# Altium footprint library Footprints_SOC.PcbLib: 182 footprints (part 1 of 12)
Each footprint in its own frame and in the unit in brackets; x right, y up, seen from the top. Pads: shape width x height; smd on the part's side, far side on the other; paste and mask are expansions set on the pad; w line width, h text height; cw(c..) or ccw(c..) is an arc to the next point about the centre after c.
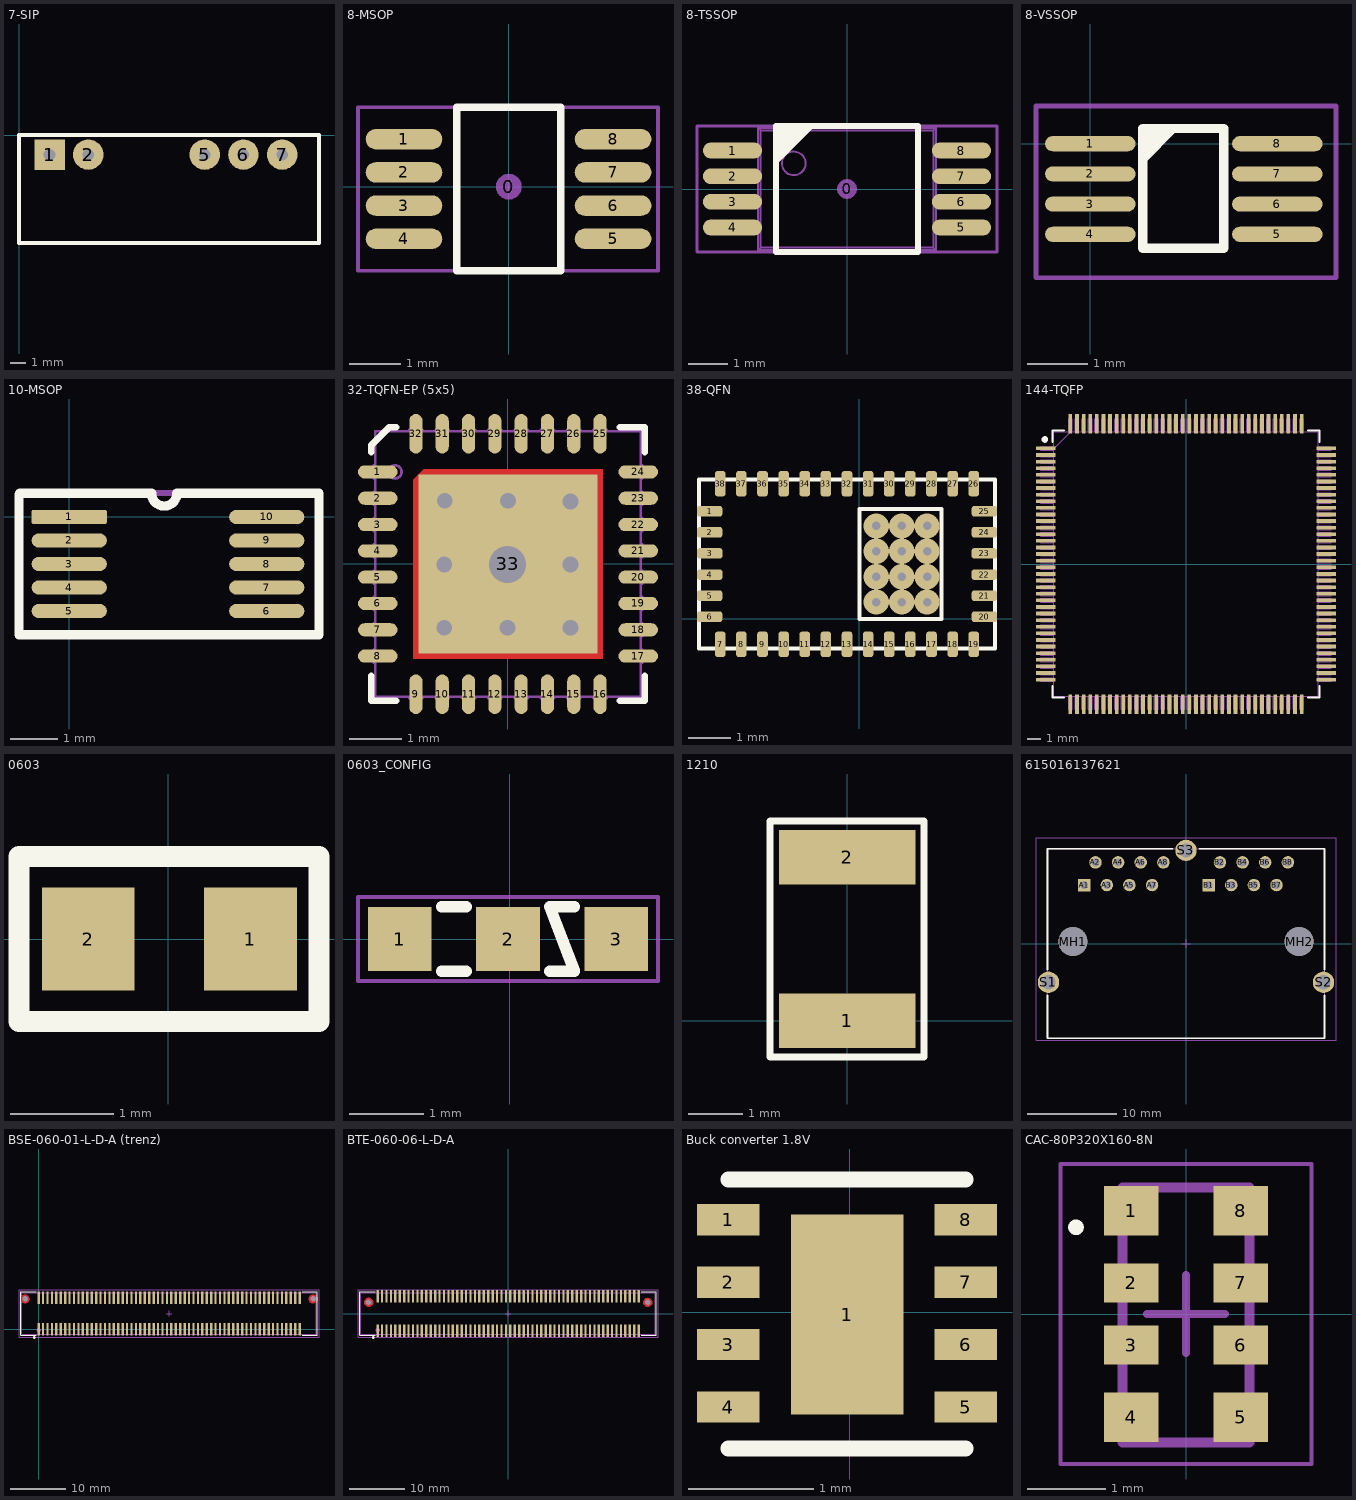
[diagram p0: the footprints below, top view; thin cyan lines are the x and y axes]

## 7-SIP [mm] "5 pins"
pads (5):
  rect 2x2 hole 0.762: 1(2,-1.27)
  round 2 hole 0.762: 2(4.54,-1.27) 5(12.16,-1.27) 6(14.7,-1.27) 7(17.24,-1.27)
Top Overlay:
  lines w0.254: 0,-7.05 19.65,-7.05 19.65,0 0,0 0,-7.05
3D body "DC DC RECOM SERIE RKZ_S.step": height 10.5, standoff -3.8, extent 0,-7.05 19.65,0

## 8-MSOP [mm] "8 Leads, Body 3.1x4.5mm (max), Pitch 0.65mm, IPC Medium Density"
height 1.2
pads (9):
  round 0.508 on Mech15: 0(0,0)
  oval 1.5x0.4 smd paste-0.051: 1(-2.05,0.93) 2(-2.05,0.28) 3(-2.05,-0.37) 4(-2.05,-1.02) 5(2.04,-1.02) 6(2.04,-0.37) 7(2.04,0.28) 8(2.04,0.93)
Top Overlay:
  lines w0.152: -1.016,-1.645 -1.016,1.555 1.016,1.555 1.016,-1.645 -1.016,-1.645
  text "." at -2,1.655 h0.1
Mechanical 15:
  lines w0.076: -2.95,-1.645 -2.95,1.555 2.92,1.555 2.92,-1.645 -2.95,-1.645
3D body "msop-8.SLDPRT": height 1.15, standoff 0, extent -2.45,-1.53 2.45,1.47

## 8-TSSOP [mm] "TSSOP, 8 Leads, Body 3.1x4.5mm (max), Pitch 0.65mm, IPC Medium Density"
height 1.2
pads (9):
  round 0.508 on Mech15: 0(0,0)
  oval 1.5x0.4 smd paste-0.051: 1(-2.9,0.975) 2(-2.9,0.325) 3(-2.9,-0.325) 4(-2.9,-0.975) 5(2.9,-0.975) 6(2.9,-0.325) 7(2.9,0.325) 8(2.9,0.975)
Top Overlay:
  region: -1.8,1.6 -0.8,1.6 -1.8,0.6
  lines w0.152: -1.8,-1.6 -1.8,1.6 1.8,1.6 1.8,-1.6 -1.8,-1.6
  text "." at -2.85,1.7 h0.1
Top Solder:
  rectangle: -3.5,-1.016 -2.3,1.016
  region: 3.5,1.016 2.3,1.016 2.3,-1.016 3.5,-1.016
Mechanical 13:
  circle w0.05: c-1.35,0.65 r0.3
  lines w0.05: -2.839,-1.125 -2.839,-0.825 ; -2.839,-0.475 -2.839,-0.175 ; -2.839,0.175 -2.839,0.475 ; -2.839,0.825 -2.839,1.125 ; -2.795,-1.125 -2.795,-0.825 ; -2.795,-0.475 -2.795,-0.175 ; -2.795,0.175 -2.795,0.475 ; -2.795,0.825 -2.795,1.125 ; -2.693,-1.125 -2.693,-0.825 ; -2.693,-0.475 -2.693,-0.175 ; -2.693,0.175 -2.693,0.475 ; -2.693,0.825 -2.693,1.125 ; -2.5,-1.125 -2.5,-0.825 ; -2.5,-0.475 -2.5,-0.175 ; -2.5,0.175 -2.5,0.475 ; -2.5,0.825 -2.5,1.125 ; -2.25,-1.125 -3.25,-1.125 -3.25,-0.825 -2.25,-0.825 ; -2.25,-0.475 -3.25,-0.475 -3.25,-0.175 -2.25,-0.175 ; -2.25,0.175 -3.25,0.175 -3.25,0.475 -2.25,0.475 ; -2.25,0.825 -3.25,0.825 -3.25,1.125 -2.25,1.125 ; 2.25,-1.125 3.25,-1.125 3.25,-0.825 2.25,-0.825 ; 2.25,-0.475 3.25,-0.475 3.25,-0.175 2.25,-0.175 ; 2.25,0.175 3.25,0.175 3.25,0.475 2.25,0.475 ; 2.25,0.825 3.25,0.825 3.25,1.125 2.25,1.125 ; 2.5,-1.125 2.5,-0.825 ; 2.5,-0.475 2.5,-0.175 ; 2.5,0.175 2.5,0.475 ; 2.5,0.825 2.5,1.125 ; 2.693,-1.125 2.693,-0.825 ; 2.693,-0.475 2.693,-0.175 ; 2.693,0.175 2.693,0.475 ; 2.693,0.825 2.693,1.125 ; 2.795,-1.125 2.795,-0.825 ; 2.795,-0.475 2.795,-0.175 ; 2.795,0.175 2.795,0.475 ; 2.795,0.825 2.795,1.125 ; 2.839,-1.125 2.839,-0.825 ; 2.839,-0.475 2.839,-0.175 ; 2.839,0.175 2.839,0.475 ; 2.839,0.825 2.839,1.125 ; -2.25,-1.55 -2.25,1.55 ; -2.25,-1.55 -2.187,-1.487 ; -2.25,-1.55 2.25,-1.55 ; -2.25,1.55 2.25,1.55 ; -2.25,1.55 -2.187,1.487 ; -2.187,-1.487 -2.187,1.487 ; -2.187,-1.487 2.187,-1.487 ; -2.187,1.487 2.187,1.487 ; 2.187,-1.487 2.187,1.487 ; 2.187,-1.487 2.25,-1.55 ; 2.187,1.487 2.25,1.55 ; 2.25,-1.55 2.25,1.55
Mechanical 15:
  lines w0.076: -3.8,-1.6 -3.8,1.6 3.8,1.6 3.8,-1.6 -3.8,-1.6
3D body "TSSOP-8.STEP": height 1.19, standoff -0.01, extent -3.25,-1.55 3.25,1.55

## 8-VSSOP [mm] "VSSOP, 8 Leads, Pitch 0.5mm"
height 1.2
pads (8):
  oval 1.5x0.25 smd paste-0.051: 1(0,0) 2(0,-0.5) 3(0,-1) 4(0,-1.5) 5(3.1,-1.5) 6(3.1,-1) 7(3.1,-0.5) 8(3.1,0)
Top Overlay:
  region: 0.95,0.17 1.39,0.17 0.95,-0.27
  lines w0.152: 0.87,-1.73 0.87,0.25 2.21,0.25 2.21,-1.73 0.87,-1.73
  text "." at 0.05,0.64 h0.1
Mechanical 15:
  lines w0.076: -0.9,-2.22 -0.9,0.625 4.07,0.625 4.07,-2.22 -0.9,-2.22
3D body "8-VSSOP.step": height 0.9, standoff 0, extent -0.05,-1.8 3.15,0.3

## 10-MSOP [mm]
pads (10):
  rrect25% 1.6x0.3 smd mask+0.05: 1(0,0)
  oval 1.6x0.3 smd mask+0.05: 2(0,-0.5) 3(0,-1) 4(0,-1.5) 5(0,-2) 6(4.2,-2) 7(4.2,-1.5) 8(4.2,-1) 9(4.2,-0.5) 10(4.2,0)
Top Overlay:
  lines w0.2: 1.725,0.5 -1.049,0.5 -1.067,0.483 -1.067,-2.5 5.309,-2.5 5.309,0.5 2.3,0.5 ; 1.75,0.5 ccw(c2.019,0.5) 2.289,0.5
  text "." at 1.08,-0.08 h2
Mechanical 15:
  lines w0.127: -1.067,-2.489 5.309,-2.489 5.309,0.508 -1.067,0.508 -1.067,-2.489
3D body: height 1.1, standoff 0, extent 0.625,-2.5 3.625,0.525
3D body: height 0.15, standoff 0, extent -0.375,-2.125 4.6,0.125

## 32-TQFN-EP (5x5) [mm] "QFN, 32-Leads with exposed die pad, Body 5.1x5.1mm (max), Pitch 0.50mm, IPC Medium Density"
height 0.8
pads (33):
  oval 0.75x0.25 smd mask+0.075: 1(-2.475,1.75) 2(-2.475,1.25) 3(-2.475,0.75) 4(-2.475,0.25) 5(-2.475,-0.25) 6(-2.475,-0.75) 7(-2.475,-1.25) 8(-2.475,-1.75) 17(2.475,-1.75) 18(2.475,-1.25) 19(2.475,-0.75) 20(2.475,-0.25) 21(2.475,0.25) 22(2.475,0.75) 23(2.475,1.25) 24(2.475,1.75)
  oval 0.25x0.75 smd mask+0.075: 9(-1.75,-2.475) 10(-1.25,-2.475) 11(-0.75,-2.475) 12(-0.25,-2.475) 13(0.25,-2.475) 14(0.75,-2.475) 15(1.25,-2.475) 16(1.75,-2.475) 25(1.75,2.475) 26(1.25,2.475) 27(0.75,2.475) 28(0.25,2.475) 29(-0.25,2.475) 30(-0.75,2.475) 31(-1.25,2.475) 32(-1.75,2.475)
  rect 3.4x3.4 smd paste-1.7: 33(0,0)
via -1.2,1.2 diameter 0.7 hole 0.3
via 0,1.2 diameter 0.7 hole 0.3
via 1.19,1.19 diameter 0.7 hole 0.3
via 1.19,-0.01 diameter 0.7 hole 0.3
via -0.01,-0.01 diameter 1.3 hole 0.7
via -1.21,-0.01 diameter 0.7 hole 0.3
via -1.21,-1.21 diameter 0.7 hole 0.3
via -0.01,-1.21 diameter 0.7 hole 0.3
via 1.19,-1.21 diameter 0.7 hole 0.3
Top Layer:
  region: -1.8,1.6 -1.6,1.8 1.8,1.8 1.8,1.6
  region: -1.6,1.8 -1.8,1.6 -1.8,-1.8 -1.6,-1.8
  region: -1.8,-1.6 -1.6,-1.8 1.8,-1.8 1.8,-1.6
  region: 1.6,-1.8 1.8,-1.6 1.8,1.8 1.6,1.8
Top Overlay:
  lines w0.127: -2.6,-2.125 -2.6,-2.6 -2.125,-2.6 ; -2.6,2.125 -2.6,2.25 -2.25,2.6 -2.125,2.6 ; 2.125,-2.6 2.6,-2.6 2.6,-2.125 ; 2.125,2.6 2.6,2.6 2.6,2.125
  text "." at -3.23,1.75 h0.05
Top Paste:
  region: -0.9,-1.8 -1,-1.7 -1,-1.1 -1.1,-1 -1.7,-1 -1.8,-0.9 -1.8,-0.3 -1.7,-0.2 -0.3,-0.2 -0.2,-0.3 -0.2,-1.7 -0.3,-1.8
  region: -1.8,0.9 -1.7,1 -1.1,1 -1,1.1 -1,1.7 -0.9,1.8 -0.3,1.8 -0.2,1.7 -0.2,0.3 -0.3,0.2 -1.7,0.2 -1.8,0.3
  region: 0.9,1.8 1,1.7 1,1.1 1.1,1 1.7,1 1.8,0.9 1.8,0.3 1.7,0.2 0.3,0.2 0.2,0.3 0.2,1.7 0.3,1.8
  region: 1.8,-0.9 1.7,-1 1.1,-1 1,-1.1 1,-1.7 0.9,-1.8 0.3,-1.8 0.2,-1.7 0.2,-0.3 0.3,-0.2 1.7,-0.2 1.8,-0.3
Top Solder:
  circle w0.4: c1.2,0 r0.4
  circle w0.4: c0,1.2 r0.4
  circle w0.4: c-1.2,0 r0.4
  circle w0.4: c-1.2,1.2 r0.4
  circle w0.4: c1.2,1.2 r0.4
  circle w0.4: c0,0 r0.4
  circle w0.4: c-1.2,-1.2 r0.4
  circle w0.4: c0,-1.2 r0.4
  circle w0.4: c1.2,-1.2 r0.4
  rectangle: -0.9,-1.8 -0.3,1.8
  region: 0.9,1.8 0.3,1.8 0.3,-1.8 0.9,-1.8
  region: -1.8,0.9 -1.8,0.3 1.8,0.3 1.8,0.9
  region: 1.8,-0.9 1.8,-0.3 -1.8,-0.3 -1.8,-0.9
Mechanical 13:
  circle w0.05: c-2.148,1.75 r0.125
  lines w0.05: -2.525,-1.875 -2.545,-1.875 -2.545,-1.625 -2.525,-1.625 ; -2.525,-1.375 -2.545,-1.375 -2.545,-1.125 -2.525,-1.125 ; -2.525,-0.875 -2.545,-0.875 -2.545,-0.625 -2.525,-0.625 ; -2.525,-0.375 -2.545,-0.375 -2.545,-0.125 -2.525,-0.125 ; -2.525,0.125 -2.545,0.125 -2.545,0.375 -2.525,0.375 ; -2.525,0.625 -2.545,0.625 -2.545,0.875 -2.525,0.875 ; -2.525,1.125 -2.545,1.125 -2.545,1.375 -2.525,1.375 ; -2.525,1.625 -2.545,1.625 -2.545,1.875 -2.525,1.875 ; -1.875,-2.525 -1.875,-2.545 -1.625,-2.545 -1.625,-2.525 ; -1.875,2.525 -1.875,2.545 -1.625,2.545 -1.625,2.525 ; -1.375,-2.525 -1.375,-2.545 -1.125,-2.545 -1.125,-2.525 ; -1.375,2.525 -1.375,2.545 -1.125,2.545 -1.125,2.525 ; -0.875,-2.525 -0.875,-2.545 -0.625,-2.545 -0.625,-2.525 ; -0.875,2.525 -0.875,2.545 -0.625,2.545 -0.625,2.525 ; -0.375,-2.525 -0.375,-2.545 -0.125,-2.545 -0.125,-2.525 ; -0.375,2.525 -0.375,2.545 -0.125,2.545 -0.125,2.525 ; 0.125,-2.525 0.125,-2.545 0.375,-2.545 0.375,-2.525 ; 0.125,2.525 0.125,2.545 0.375,2.545 0.375,2.525 ; 0.625,-2.525 0.625,-2.545 0.875,-2.545 0.875,-2.525 ; 0.625,2.525 0.625,2.545 0.875,2.545 0.875,2.525 ; 1.125,-2.525 1.125,-2.545 1.375,-2.545 1.375,-2.525 ; 1.125,2.525 1.125,2.545 1.375,2.545 1.375,2.525 ; 1.625,-2.525 1.625,-2.545 1.875,-2.545 1.875,-2.525 ; 1.625,2.525 1.625,2.545 1.875,2.545 1.875,2.525 ; 2.525,-1.875 2.545,-1.875 2.545,-1.625 2.525,-1.625 ; 2.525,-1.375 2.545,-1.375 2.545,-1.125 2.525,-1.125 ; 2.525,-0.875 2.545,-0.875 2.545,-0.625 2.525,-0.625 ; 2.525,-0.375 2.545,-0.375 2.545,-0.125 2.525,-0.125 ; 2.525,0.125 2.545,0.125 2.545,0.375 2.525,0.375 ; 2.525,0.625 2.545,0.625 2.545,0.875 2.525,0.875 ; 2.525,1.125 2.545,1.125 2.545,1.375 2.525,1.375 ; 2.525,1.625 2.545,1.625 2.545,1.875 2.525,1.875 ; -2.525,-2.525 2.525,-2.525 2.525,2.525 -2.525,2.525 -2.525,-2.525
3D body "QFN50P500X500X80-33N.STEP": height 0.8, standoff 0, extent -2.545,-2.545 2.545,2.545

## 38-QFN [mm] "7x4"
pads (38):
  rrect50% 0.6x0.25 smd: 1(-3.545,2.55) 2(-3.545,2.05) 3(-3.545,1.55) 4(-3.545,1.05) 5(-3.545,0.55) 6(-3.545,0.05) 20(2.955,0.05) 21(2.955,0.55) 22(2.955,1.05) 23(2.955,1.55) 24(2.955,2.05) 25(2.955,2.55)
  rrect50% 0.25x0.6 smd: 7(-3.295,-0.6) 8(-2.795,-0.6) 9(-2.295,-0.6) 10(-1.795,-0.6) 11(-1.295,-0.6) 12(-0.795,-0.6) 13(-0.295,-0.6) 14(0.205,-0.6) 15(0.705,-0.6) 16(1.205,-0.6) 17(1.705,-0.6) 18(2.205,-0.6) 19(2.705,-0.6) 26(2.705,3.2) 27(2.205,3.2) 28(1.705,3.2) 29(1.205,3.2) 30(0.705,3.2) 31(0.205,3.2) 32(-0.295,3.2) 33(-0.795,3.2) 34(-1.295,3.2) 35(-1.795,3.2) 36(-2.295,3.2) 37(-2.795,3.2) 38(-3.295,3.2)
via 0.4,0.4 diameter 0.6 hole 0.2
via 1,0.4 diameter 0.6 hole 0.2
via 1.6,0.4 diameter 0.6 hole 0.2
via 0.4,1 diameter 0.6 hole 0.2
via 1,1 diameter 0.6 hole 0.2
via 1.6,1 diameter 0.6 hole 0.2
via 0.4,1.6 diameter 0.6 hole 0.2
via 1,1.6 diameter 0.6 hole 0.2
via 1.6,1.6 diameter 0.6 hole 0.2
via 1.6,2.2 diameter 0.6 hole 0.2
via 1,2.2 diameter 0.6 hole 0.2
via 0.4,2.2 diameter 0.6 hole 0.2
Top Overlay:
  lines w0.1: -3.795,-0.7 3.205,-0.7 3.205,3.3 -3.795,3.3 -3.795,-0.7 ; 0,0 0,2.6 1.94,2.6 1.94,0 0,0

## 144-TQFP [mil] "Pitch 0.5mm"
pads (144):
  rect 58x11 smd: 1(-418,344.49) 2(-418,324.8) 3(-418,305.12) 4(-418,285.43) 5(-418,265.75) 6(-418,246.06) 7(-418,226.38) 8(-418,206.69) 9(-418,187.01) 10(-418,167.32) 11(-418,147.64) 12(-418,127.95) 13(-418,108.27) 14(-418,88.58) 15(-418,68.9) 16(-418,49.21) 17(-418,29.53) 18(-418,9.84) 19(-418,-9.84) 20(-418,-29.53) 21(-418,-49.21) 22(-418,-68.9) 23(-418,-88.58) 24(-418,-108.27) 25(-418,-127.95) 26(-418,-147.64) 27(-418,-167.32) 28(-418,-187.01) 29(-418,-206.69) 30(-418,-226.38) 31(-418,-246.06) 32(-418,-265.75) 33(-418,-285.43) 34(-418,-305.12) 35(-418,-324.8) 36(-418,-344.49) 73(418,-344.49) 74(418,-324.8) 75(418,-305.12) 76(418,-285.43) 77(418,-265.75) 78(418,-246.06) 79(418,-226.38) 80(418,-206.69) 81(418,-187.01) 82(418,-167.32) 83(418,-147.64) 84(418,-127.95) 85(418,-108.27) 86(418,-88.58) 87(418,-68.9) 88(418,-49.21) 89(418,-29.53) 90(418,-9.84) 91(418,9.84) 92(418,29.53) 93(418,49.21) 94(418,68.9) 95(418,88.58) 96(418,108.27) 97(418,127.95) 98(418,147.64) 99(418,167.32) 100(418,187.01) 101(418,206.69) 102(418,226.38) 103(418,246.06) 104(418,265.75) 105(418,285.43) 106(418,305.12) 107(418,324.8) 108(418,344.49)
  rect 11x58 smd: 37(-344.49,-418) 38(-324.8,-418) 39(-305.12,-418) 40(-285.43,-418) 41(-265.75,-418) 42(-246.06,-418) 43(-226.38,-418) 44(-206.69,-418) 45(-187.01,-418) 46(-167.32,-418) 47(-147.64,-418) 48(-127.95,-418) 49(-108.27,-418) 50(-88.58,-418) 51(-68.9,-418) 52(-49.21,-418) 53(-29.53,-418) 54(-9.84,-418) 55(9.84,-418) 56(29.53,-418) 57(49.21,-418) 58(68.9,-418) 59(88.58,-418) 60(108.27,-418) 61(127.95,-418) 62(147.64,-418) 63(167.32,-418) 64(187.01,-418) 65(206.69,-418) 66(226.38,-418) 67(246.06,-418) 68(265.75,-418) 69(285.43,-418) 70(305.12,-418) 71(324.8,-418) 72(344.49,-418) 109(344.49,418) 110(324.8,418) 111(305.12,418) 112(285.43,418) 113(265.75,418) 114(246.06,418) 115(226.38,418) 116(206.69,418) 117(187.01,418) 118(167.32,418) 119(147.64,418) 120(127.95,418) 121(108.27,418) 122(88.58,418) 123(68.9,418) 124(49.21,418) 125(29.53,418) 126(9.84,418) 127(-9.84,418) 128(-29.53,418) 129(-49.21,418) 130(-68.9,418) 131(-88.58,418) 132(-108.27,418) 133(-127.95,418) 134(-147.64,418) 135(-167.32,418) 136(-187.01,418) 137(-206.69,418) 138(-226.38,418) 139(-246.06,418) 140(-265.75,418) 141(-285.43,418) 142(-305.12,418) 143(-324.8,418) 144(-344.49,418)
Top Overlay:
  circle w9.84: c-420.67,371.06 r4.92
  lines w6: -398.5,-363.09 -398.5,-398.5 -363.09,-398.5 ; -398.5,363.09 -398.5,398.5 -363.09,398.5 ; 363.09,-398.5 398.5,-398.5 398.5,-363.09 ; 363.09,398.5 398.5,398.5 398.5,363.09
Mechanical 1:
  drawing of 581 lines, arcs and shapes, not listed
  text "*" at -378.5,354.33 h31.25
3D body "144-TQFP.step": height 63.11, standoff 0, extent -432.87,-432.87 433.11,433.11

## 0603 [mm]
pads (2):
  rect 0.9x1 smd: 1(0.801,0) 2(-0.775,0)
Top Overlay:
  lines w0.2: -1.448,-0.801 -1.448,0.801 1.466,0.801 1.466,-0.065 1.466,-0.801 -1.448,-0.801
3D body "RESC-0603.stp": height 0.55, standoff 0, extent -0.85,-0.45 0.85,0.45

## 0603_CONFIG [mm] "0603 3-Pin Config Footprint"
height 1
pads (3):
  rect 0.85x0.85 smd: 1(-1.475,0) 2(-0.025,0) 3(1.425,0)
Top Overlay:
  lines w0.152: -0.914,-0.432 -0.584,-0.432 ; -0.914,0.432 -0.584,0.432 ; 0.533,-0.432 0.864,-0.432 0.533,0.432 0.864,0.432
Mechanical 7:
  lines w0.054: -2.032,-0.559 -2.032,0.559 1.981,0.559 1.981,-0.559 -2.032,-0.559
3D body "User Library-RESC1608X___.STEP": height 0.3, standoff 0, extent -1.55,-0.4 0.05,0.4
3D body: height 2.8, standoff -2.8, extent -1.537,-1.143 -1.537,-1.143

## 1210 [mm] "1210 SMD"
pads (2):
  rect 2.5x1 smd: 1(0,0) 2(0,3)
Top Overlay:
  lines w0.127: -1.42,-0.66 -1.42,3.66 1.41,3.66 1.41,-0.66 -1.42,-0.66
3D body "1210 smd.step": height 0.55, standoff 0, extent -1.25,-0.08 1.25,3.12

## 615016137621 [mm] "Modular Jack Horizontal Shielded Dual Port 8P8C Tab Down"
height 13.75
pads (21):
  rect 1.4x1.4 hole 0.9: A1(-11.43,6.565) B1(2.54,6.565)
  round 1.4 hole 0.9: A2(-10.16,9.105) A3(-8.89,6.565) A4(-7.62,9.105) A5(-6.35,6.565) A6(-5.08,9.105) A7(-3.81,6.565) A8(-2.54,9.105) B2(3.81,9.105) B3(5.08,6.565) B4(6.35,9.105) B5(7.62,6.565) B6(8.89,9.105) B7(10.16,6.565) B8(11.43,9.105)
  round 3.25 hole 3.25 unplated: MH1(-12.7,0.215) MH2(12.7,0.215)
  round 2.4 hole 1.6: S1(-15.435,-4.355) S2(15.435,-4.355) S3(0,10.455)
Top Overlay:
  lines w0.2: -15.56,-5.81 -15.56,-10.635 15.56,-10.635 15.56,-5.81 ; -15.56,-2.9 -15.56,10.635 -1.5,10.635 ; 1.5,10.635 15.56,10.635 15.56,-2.9
Mechanical 5:
  lines w0.1: -15.56,-10.635 15.56,-10.635 15.56,10.635 -15.56,10.635 -15.56,-10.635
  text ".Designator" at 0,0 h1.02
Mechanical 15:
  lines w0.05: -0.5,0 0.5,0 ; 0,-0.5 0,0.5 ; -16.835,-10.835 16.835,-10.835 16.835,11.855 -16.835,11.855 -16.835,-10.835
3D body "615016137621 (rev1).stp": height 13.75, standoff -3.85, extent -15.565,-10.635 15.565,10.635

## BSE-060-01-L-D-A (trenz) [mm]
height 16
pads (122):
  rrect20% 0.41x2.273 smd: 1(0,0) 2(0,5.728) 3(0.8,0) 4(0.8,5.728) 5(1.6,0) 6(1.6,5.728) 7(2.4,0) 8(2.4,5.728) 9(3.2,0) 10(3.2,5.728) 11(4,0) 12(4,5.728) 13(4.8,0) 14(4.8,5.728) 15(5.6,0) 16(5.6,5.728) 17(6.4,0) 18(6.4,5.728) 19(7.2,0) 20(7.2,5.728) 21(8,0) 22(8,5.728) 23(8.8,0) 24(8.8,5.728) 25(9.6,0) 26(9.6,5.728) 27(10.4,0) 28(10.4,5.728) 29(11.2,0) 30(11.2,5.728) 31(12,0) 32(12,5.728) 33(12.8,0) 34(12.8,5.728) 35(13.6,0) 36(13.6,5.728) 37(14.4,0) 38(14.4,5.728) 39(15.2,0) 40(15.2,5.728) 41(16,0) 42(16,5.728) 43(16.8,0) 44(16.8,5.728) 45(17.6,0) 46(17.6,5.728) 47(18.4,0) 48(18.4,5.728) 49(19.2,0) 50(19.2,5.728) 51(20,0) 52(20,5.728) 53(20.8,0) 54(20.8,5.728) 55(21.6,0) 56(21.6,5.728) 57(22.4,0) 58(22.4,5.728) 59(23.2,0) 60(23.2,5.728) 61(24,0) 62(24,5.728) 63(24.8,0) 64(24.8,5.728) 65(25.6,0) 66(25.6,5.728) 67(26.4,0) 68(26.4,5.728) 69(27.2,0) 70(27.2,5.728) 71(28,0) 72(28,5.728) 73(28.8,0) 74(28.8,5.728) 75(29.6,0) 76(29.6,5.728) 77(30.4,0) 78(30.4,5.728) 79(31.2,0) 80(31.2,5.728) 81(32,0) 82(32,5.728) 83(32.8,0) 84(32.8,5.728) 85(33.6,0) 86(33.6,5.728) 87(34.4,0) 88(34.4,5.728) 89(35.2,0) 90(35.2,5.728) 91(36,0) 92(36,5.728) 93(36.8,0) 94(36.8,5.728) 95(37.6,0) 96(37.6,5.728) 97(38.4,0) 98(38.4,5.728) 99(39.2,0) 100(39.2,5.728) 101(40,0) 102(40,5.728) 103(40.8,0) 104(40.8,5.728) 105(41.6,0) 106(41.6,5.728) 107(42.4,0) 108(42.4,5.728) 109(43.2,0) 110(43.2,5.728) 111(44,0) 112(44,5.728) 113(44.8,0) 114(44.8,5.728) 115(45.6,0) 116(45.6,5.728) 117(46.4,0) 118(46.4,5.728) 119(47.2,0) 120(47.2,5.728)
  round 0.5 hole 1.02 unplated mask+0: ""(-2.439,5.531) ""(49.639,5.531)
Top Layer:
  pour cut-out: -1.642,5.501 -1.67,5.71 -1.75,5.904 -1.878,6.072 -2.046,6.2 -2.24,6.28 -2.449,6.308 -2.658,6.28 -2.852,6.2 -3.02,6.072 -3.148,5.904 -3.228,5.71 -3.256,5.501 -3.228,5.292 -3.148,5.098 -3.02,4.93 -2.852,4.802 -2.658,4.722 -2.449,4.694 -2.24,4.722 -2.046,4.802 -1.878,4.93 -1.75,5.098 -1.67,5.292
  pour cut-out: 50.445,5.511 50.418,5.72 50.337,5.914 50.209,6.082 50.042,6.21 49.847,6.29 49.639,6.318 49.43,6.29 49.235,6.21 49.068,6.082 48.94,5.914 48.859,5.72 48.832,5.511 48.859,5.302 48.94,5.108 49.068,4.94 49.235,4.812 49.43,4.732 49.639,4.704 49.847,4.732 50.042,4.812 50.209,4.94 50.337,5.108 50.418,5.302
Top Overlay:
  circle w0.25: c-0.8,-1.486 r0.125
  lines w0.2: -0.45,-1.086 -3.225,-1.086 -3.225,6.764 -0.45,6.764 ; 47.65,-1.036 50.41,-1.036 50.41,6.784 47.65,6.784
Mechanical 13:
  circle w0.4: c0,-0.156 r0.2
  lines w0.1: -3.038,-0.882 -3.038,6.611 50.238,6.611 50.238,-0.882 -3.038,-0.882
Mechanical 15:
  lines w0.05: 3.1,7.164 44.1,7.164 ; 23.1,2.864 24.1,2.864 ; 23.6,2.364 23.6,3.364 ; -3.55,-1.436 50.7,-1.436 50.7,7.164 -3.55,7.164 -3.55,-1.436
3D body "Samtec-BSE-060-01-L-D-A.step": height 3.23, standoff -0.77, extent -3.038,-0.882 50.238,6.611

## BTE-060-06-L-D-A [mm] "Conector Samtec 120 pines hembra altura 22mm pitch 0.8mm"
height 16
pads (122):
  rrect20% 0.41x2.273 smd: 1(-23.6,-3.086) 2(-23.6,3.086) 3(-22.8,-3.086) 4(-22.8,3.086) 5(-22,-3.086) 6(-22,3.086) 7(-21.2,-3.086) 8(-21.2,3.086) 9(-20.4,-3.086) 10(-20.4,3.086) 11(-19.6,-3.086) 12(-19.6,3.086) 13(-18.8,-3.086) 14(-18.8,3.086) 15(-18,-3.086) 16(-18,3.086) 17(-17.2,-3.086) 18(-17.2,3.086) 19(-16.4,-3.086) 20(-16.4,3.086) 21(-15.6,-3.086) 22(-15.6,3.086) 23(-14.8,-3.086) 24(-14.8,3.086) 25(-14,-3.086) 26(-14,3.086) 27(-13.2,-3.086) 28(-13.2,3.086) 29(-12.4,-3.086) 30(-12.4,3.086) 31(-11.6,-3.086) 32(-11.6,3.086) 33(-10.8,-3.086) 34(-10.8,3.086) 35(-10,-3.086) 36(-10,3.086) 37(-9.2,-3.086) 38(-9.2,3.086) 39(-8.4,-3.086) 40(-8.4,3.086) 41(-7.6,-3.086) 42(-7.6,3.086) 43(-6.8,-3.086) 44(-6.8,3.086) 45(-6,-3.086) 46(-6,3.086) 47(-5.2,-3.086) 48(-5.2,3.086) 49(-4.4,-3.086) 50(-4.4,3.086) 51(-3.6,-3.086) 52(-3.6,3.086) 53(-2.8,-3.086) 54(-2.8,3.086) 55(-2,-3.086) 56(-2,3.086) 57(-1.2,-3.086) 58(-1.2,3.086) 59(-0.4,-3.086) 60(-0.4,3.086) 61(0.4,-3.086) 62(0.4,3.086) 63(1.2,-3.086) 64(1.2,3.086) 65(2,-3.086) 66(2,3.086) 67(2.8,-3.086) 68(2.8,3.086) 69(3.6,-3.086) 70(3.6,3.086) 71(4.4,-3.086) 72(4.4,3.086) 73(5.2,-3.086) 74(5.2,3.086) 75(6,-3.086) 76(6,3.086) 77(6.8,-3.086) 78(6.8,3.086) 79(7.6,-3.086) 80(7.6,3.086) 81(8.4,-3.086) 82(8.4,3.086) 83(9.2,-3.086) 84(9.2,3.086) 85(10,-3.086) 86(10,3.086) 87(10.8,-3.086) 88(10.8,3.086) 89(11.6,-3.086) 90(11.6,3.086) 91(12.4,-3.086) 92(12.4,3.086) 93(13.2,-3.086) 94(13.2,3.086) 95(14,-3.086) 96(14,3.086) 97(14.8,-3.086) 98(14.8,3.086) 99(15.6,-3.086) 100(15.6,3.086) 101(16.4,-3.086) 102(16.4,3.086) 103(17.2,-3.086) 104(17.2,3.086) 105(18,-3.086) 106(18,3.086) 107(18.8,-3.086) 108(18.8,3.086) 109(19.6,-3.086) 110(19.6,3.086) 111(20.4,-3.086) 112(20.4,3.086) 113(21.2,-3.086) 114(21.2,3.086) 115(22,-3.086) 116(22,3.086) 117(22.8,-3.086) 118(22.8,3.086) 119(23.6,-3.086) 120(23.6,3.086)
  round 0.5 hole 1.02 unplated mask+0: ""(-25.238,2.032) ""(25.238,2.032)
Top Layer:
  pour cut-out: -24.409,2.027 -24.436,2.236 -24.517,2.43 -24.645,2.597 -24.812,2.726 -25.007,2.806 -25.216,2.834 -25.424,2.806 -25.619,2.726 -25.786,2.597 -25.914,2.43 -25.995,2.236 -26.022,2.027 -25.995,1.818 -25.914,1.623 -25.786,1.456 -25.619,1.328 -25.424,1.247 -25.216,1.22 -25.007,1.247 -24.812,1.328 -24.645,1.456 -24.517,1.623 -24.436,1.818
  pour cut-out: 26.05,2.025 26.022,2.234 25.942,2.429 25.814,2.596 25.646,2.724 25.452,2.805 25.243,2.832 25.034,2.805 24.84,2.724 24.672,2.596 24.544,2.429 24.464,2.234 24.436,2.025 24.464,1.816 24.544,1.622 24.672,1.455 24.84,1.327 25.034,1.246 25.243,1.218 25.452,1.246 25.646,1.327 25.814,1.455 25.942,1.622 26.022,1.816
Top Overlay:
  circle w0.25: c-24.4,-4.35 r0.125
  lines w0.2: -24.05,-3.95 -26.825,-3.95 -26.825,3.9 -24.05,3.9 ; 24.05,-3.9 26.81,-3.9 26.81,3.92 24.05,3.92
Mechanical 13:
  circle w0.4: c-23.6,-3.02 r0.2
  lines w0.1: -26.638,-3.746 -26.638,3.747 26.639,3.747 26.639,-3.746 -26.638,-3.746
Mechanical 15:
  lines w0.05: -20.5,4.3 20.5,4.3 ; -0.5,0 0.5,0 ; 0,-0.5 0,0.5 ; -27.15,-4.3 27.1,-4.3 27.1,4.3 -27.15,4.3 -27.15,-4.3
3D body "BTE-060-06-L-D-A.stp": height 21.26, standoff -0.75, extent -26.003,-3.556 26.004,3.556

## Buck converter 1.8V [mm] "8-WSON"
pads (9):
  rect 0.5x0.25 smd: 1(-0.97,0.74) 2(-0.97,0.24) 3(-0.97,-0.26) 4(-0.97,-0.76) 5(0.93,-0.76) 6(0.93,-0.26) 7(0.93,0.24) 8(0.93,0.74)
  rect 0.9x1.6 smd mask+0.02: 1(-0.02,-0.02)
Top Overlay:
  lines w0.127: -0.97,-1.09 0.93,-1.09 ; -0.97,1.06 0.93,1.06
  text "." at -1.58,0.64 h1.52

## CAC-80P320X160-8N [mm] "Chip Array, ConvexS, 8-Leads, Pitch 0,80mm,  Body 3,20x1,60mm,  IPC Medium Density"
height 1
pads (8):
  rect 0.7x0.64 smd: 1(-0.7,1.325) 4(-0.7,-1.325) 5(0.7,-1.325) 8(0.7,1.325)
  rect 0.7x0.5 smd: 2(-0.7,0.4) 3(-0.7,-0.4) 6(0.7,-0.4) 7(0.7,0.4)
Top Overlay:
  circle w0.1: c-1.412,1.113 r0.05
Mechanical 3:
  lines w0.127: -0.813,-1.651 -0.813,1.626 0.813,1.626 0.813,-1.651 -0.813,-1.651
Mechanical 15:
  lines w0.05: -1.61,-1.925 1.61,-1.925 1.61,1.925 -1.61,1.925 -1.61,-1.925
  lines w0.1: -0.5,0 0.5,0 ; 0,-0.5 0,0.5
3D body "User Library-RESCAXS80P160X320X60-8N.STEP": height 0.45, standoff -0.05, extent -0.8,-1.65 0.8,1.65